# Altium footprint library cool_library.PcbLib: 1182 footprints (part 17 of 75)
Each footprint in its own frame and in the unit in brackets; x right, y up, seen from the top. Pads: shape width x height; smd on the part's side, far side on the other; paste and mask are expansions set on the pad; w line width, h text height; cw(c..) or ccw(c..) is an arc to the next point about the centre after c.
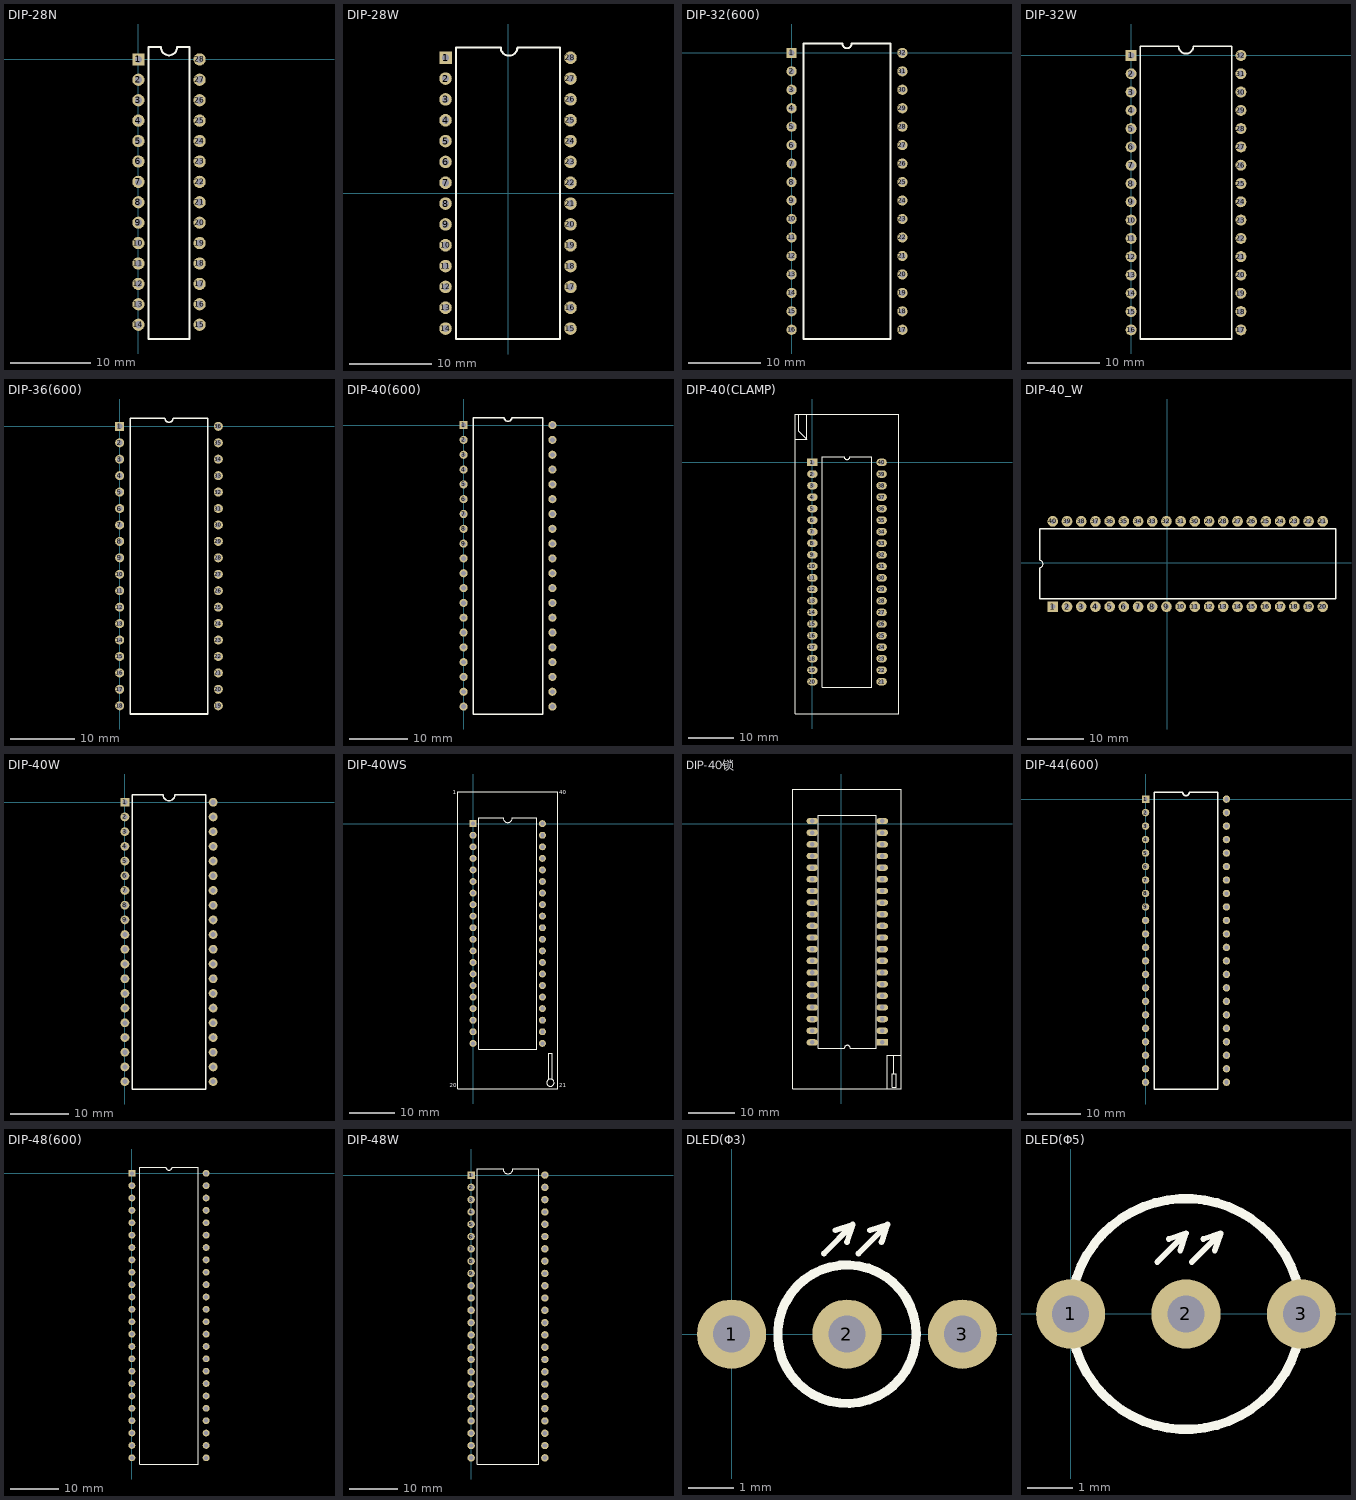
[diagram p16: the footprints below, top view; thin cyan lines are the x and y axes]

## DIP-28N [mil]
pads (28):
  rect 60x60 hole 35: 1(0,0)
  round 60 hole 35: 2(0,-100) 3(0,-200) 4(0,-300) 5(0,-400) 6(0,-500) 7(0,-600) 8(0,-700) 9(0,-800) 10(0,-900) 11(0,-1000) 12(0,-1100) 13(0,-1200) 14(0,-1300) 15(300,-1300) 16(300,-1200) 17(300,-1100) 18(300,-1000) 19(300,-900) 20(300,-800) 21(300,-700) 22(300,-600) 23(300,-500) 24(300,-400) 25(300,-300) 26(300,-200) 27(300,-100) 28(300,0)
Top Overlay:
  lines w10: 50,-1370 50,60 110,60 ccw(c150,60) 190,60 250,60 250,-1370 50,-1370

## DIP-28W [mil]
pads (28):
  rect 60x60 hole 35: 1(-300,650)
  round 60 hole 35: 2(-300,550) 3(-300,450) 4(-300,350) 5(-300,250) 6(-300,150) 7(-300,50) 8(-300,-50) 9(-300,-150) 10(-300,-250) 11(-300,-350) 12(-300,-450) 13(-300,-550) 14(-300,-650) 15(300,-650) 16(300,-550) 17(300,-450) 18(300,-350) 19(300,-250) 20(300,-150) 21(300,-50) 22(300,50) 23(300,150) 24(300,250) 25(300,350) 26(300,450) 27(300,550) 28(300,650)
Top Overlay:
  lines w10: -250,-700 -250,700 -35,700 ccw(c5,700) 45,700 250,700 250,-700 -250,-700

## DIP-32(600) [mil]
pads (32):
  rect 55x55 hole 32: 1(0,0)
  round 55 hole 32: 2(0,-100) 3(0,-200) 4(0,-300) 5(0,-400) 6(0,-500) 7(0,-600) 8(0,-700) 9(0,-800) 10(0,-900) 11(0,-1000) 12(0,-1100) 13(0,-1200) 14(0,-1300) 15(0,-1400) 16(0,-1500) 17(600,-1500) 18(600,-1400) 19(600,-1300) 20(600,-1200) 21(600,-1100) 22(600,-1000) 23(600,-900) 24(600,-800) 25(600,-700) 26(600,-600) 27(600,-500) 28(600,-400) 29(600,-300) 30(600,-200) 31(600,-100) 32(600,0)
Top Overlay:
  lines w10: 65,-1550 535,-1550 535,50 325,50 cw(c300,50) 275,50 65,50 65,-1550

## DIP-32W [mil]
pads (32):
  rect 60x60 hole 35: 1(0,0)
  round 60 hole 35: 2(0,-100) 3(0,-200) 4(0,-300) 5(0,-400) 6(0,-500) 7(0,-600) 8(0,-700) 9(0,-800) 10(0,-900) 11(0,-1000) 12(0,-1100) 13(0,-1200) 14(0,-1300) 15(0,-1400) 16(0,-1500) 17(600,-1500) 18(600,-1400) 19(600,-1300) 20(600,-1200) 21(600,-1100) 22(600,-1000) 23(600,-900) 24(600,-800) 25(600,-700) 26(600,-600) 27(600,-500) 28(600,-400) 29(600,-300) 30(600,-200) 31(600,-100) 32(600,0)
Top Overlay:
  lines w10: 50,-1550 550,-1550 550,50 340,50 cw(c300,50) 260,50 50,50 50,-1550

## DIP-36(600) [mil]
pads (36):
  rect 55x55 hole 32: 1(0,0)
  round 55 hole 32: 2(0,-100) 3(0,-200) 4(0,-300) 5(0,-400) 6(0,-500) 7(0,-600) 8(0,-700) 9(0,-800) 10(0,-900) 11(0,-1000) 12(0,-1100) 13(0,-1200) 14(0,-1300) 15(0,-1400) 16(0,-1500) 17(0,-1600) 18(0,-1700) 19(600,-1700) 20(600,-1600) 21(600,-1500) 22(600,-1400) 23(600,-1300) 24(600,-1200) 25(600,-1100) 26(600,-1000) 27(600,-900) 28(600,-800) 29(600,-700) 30(600,-600) 31(600,-500) 32(600,-400) 33(600,-300) 34(600,-200) 35(600,-100) 36(600,0)
Top Overlay:
  lines w10: 65,-1750 535,-1750 535,50 325,50 cw(c300,50) 275,50 65,50 65,-1750

## DIP-40(600) [mil]
pads (40):
  rect 55x55 hole 32: 1(0,0)
  round 55 hole 32: 2(0,-100) 3(0,-200) 4(0,-300) 5(0,-400) 6(0,-500) 7(0,-600) 8(0,-700) 9(0,-800) 10(0,-900) 11(0,-1000) 12(0,-1100) 13(0,-1200) 14(0,-1300) 15(0,-1400) 16(0,-1500) 17(0,-1600) 18(0,-1700) 19(0,-1800) 20(0,-1900) 21(600,-1900) 22(600,-1800) 23(600,-1700) 24(600,-1600) 25(600,-1500) 26(600,-1400) 27(600,-1300) 28(600,-1200) 29(600,-1100) 30(600,-1000) 31(600,-900) 32(600,-800) 33(600,-700) 34(600,-600) 35(600,-500) 36(600,-400) 37(600,-300) 38(600,-200) 39(600,-100) 40(600,0)
Top Overlay:
  lines w10: 65,-1950 535,-1950 535,50 325,50 cw(c300,50) 275,50 65,50 65,-1950

## DIP-40(CLAMP) [mil]
pads (40):
  rect 90x65 hole 40: 1(0,0)
  oval 90x65 hole 40: 2(0,-100) 3(0,-200) 4(0,-300) 5(0,-400) 6(0,-500) 7(0,-600) 8(0,-700) 9(0,-800) 10(0,-900) 11(0,-1000) 12(0,-1100) 13(0,-1200) 14(0,-1300) 15(0,-1400) 16(0,-1500) 17(0,-1600) 18(0,-1700) 19(0,-1800) 20(0,-1900) 21(600,-1900) 22(600,-1800) 23(600,-1700) 24(600,-1600) 25(600,-1500) 26(600,-1400) 27(600,-1300) 28(600,-1200) 29(600,-1100) 30(600,-1000) 31(600,-900) 32(600,-800) 33(600,-700) 34(600,-600) 35(600,-500) 36(600,-400) 37(600,-300) 38(600,-200) 39(600,-100) 40(600,0)
Top Overlay:
  lines w10: -150,200 -50,200 ; -120,410 -120,270 -50,200 ; -50,420 -50,200 ; -150,-2180 -150,420 750,420 750,-2180 -150,-2180 ; 85,-1950 85,50 275,50 ccw(c300,50) 325,50 515,50 515,-1950 85,-1950

## DIP-40_W [mil]
height 177.17
pads (40):
  rect 75x75 hole 36: 1(-807.02,-309.59)
  round 75 hole 36: 2(-707.02,-309.59) 3(-607.02,-309.59) 4(-507.02,-309.59) 5(-407.02,-309.59) 6(-307.02,-309.59) 7(-207.02,-309.59) 8(-107.02,-309.59) 9(-7.02,-309.59) 10(92.98,-309.59) 11(192.98,-309.59) 12(292.98,-309.59) 13(392.98,-309.59) 14(492.98,-309.59) 15(592.98,-309.59) 16(692.98,-309.59) 17(792.98,-309.59) 18(892.98,-309.59) 19(992.98,-309.59) 20(1092.98,-309.59) 21(1092.98,290.41) 22(992.98,290.41) 23(892.98,290.41) 24(792.98,290.41) 25(692.98,290.41) 26(592.98,290.41) 27(492.98,290.41) 28(392.98,290.41) 29(292.98,290.41) 30(192.98,290.41) 31(92.98,290.41) 32(-7.02,290.41) 33(-107.02,290.41) 34(-207.02,290.41) 35(-307.02,290.41) 36(-407.02,290.41) 37(-507.02,290.41) 38(-607.02,290.41) 39(-707.02,290.41) 40(-807.02,290.41)
Top Overlay:
  lines w7.87: -900.33,-34.59 ccw(c-900.33,-9.59) -900.33,15.41
  lines w10: -900.33,-34.59 -900.33,-255 1186.28,-255 1186.28,240 -900.33,240 -900.33,15.41
3D body: height 224.41, standoff -101.57, extent -892.48,-314.92 1172.48,294.93

## DIP-40W [mil]
pads (40):
  rect 60x60 hole 35: 1(0,0)
  round 60 hole 35: 2(0,-100) 3(0,-200) 4(0,-300) 5(0,-400) 6(0,-500) 7(0,-600) 8(0,-700) 9(0,-800) 10(0,-900) 11(0,-1000) 12(0,-1100) 13(0,-1200) 14(0,-1300) 15(0,-1400) 16(0,-1500) 17(0,-1600) 18(0,-1700) 19(0,-1800) 20(0,-1900) 21(600,-1900) 22(600,-1800) 23(600,-1700) 24(600,-1600) 25(600,-1500) 26(600,-1400) 27(600,-1300) 28(600,-1200) 29(600,-1100) 30(600,-1000) 31(600,-900) 32(600,-800) 33(600,-700) 34(600,-600) 35(600,-500) 36(600,-400) 37(600,-300) 38(600,-200) 39(600,-100) 40(600,0)
Top Overlay:
  lines w10: 50,-1950 550,-1950 550,50 340,50 cw(c300,50) 260,50 50,50 50,-1950

## DIP-40WS [mil]
pads (40):
  rect 60x60 hole 35.43: 1(0,0)
  round 60 hole 35.43: 2(0,-100) 3(0,-200) 4(0,-300) 5(0,-400) 6(0,-500) 8(0,-700) 9(0,-800) 10(0,-900) 11(0,-1000) 12(0,-1100) 13(0,-1200) 14(0,-1300) 15(0,-1400) 16(0,-1500) 17(0,-1600) 18(0,-1700) 19(0,-1800) 20(0,-1900) 21(600,-1900) 22(600,-1800) 23(600,-1700) 24(600,-1600) 25(600,-1500) 26(600,-1400) 27(600,-1300) 28(600,-1200) 29(600,-1100) 30(600,-1000) 31(600,-900) 32(600,-800) 33(600,-700) 34(600,-600) 35(600,-500) 36(600,-400) 37(600,-300) 38(600,-200) 39(600,-100) 40(600,0)
  round 60 hole 35.43 paste+0: 7(0,-600)
Top Overlay:
  circle w10: c669.38,-2240 r31.5
  lines w10: 655,-2210 655,-1985 683.77,-1985 683.77,-2210 ; -133.07,-2293.7 733.07,-2293.7 733.07,275.59 -133.07,275.59 -133.07,-2293.7 ; 50,-1950 50,50 260,50 ccw(c300,50) 340,50 550,50 550,-1950 50,-1950
  text "40" at 745,240 h60
  text "21" at 745,-2295 h60
  text "20" at -200,-2295 h60
  text "1" at -175,240 h60

## DIP-40锁 [mm]
pads (40):
  rect 2.5x1.38 hole 1: 1(8.89,-47.65)
  oval 2.5x1.38 hole 1: 2(8.89,-45.11) 3(8.89,-42.57) 4(8.89,-40.03) 5(8.89,-37.49) 6(8.89,-34.95) 7(8.89,-32.41) 8(8.89,-29.87) 9(8.89,-27.33) 10(8.89,-24.79) 11(8.89,-22.25) 12(8.89,-19.71) 13(8.89,-17.17) 14(8.89,-14.63) 15(8.89,-12.09) 16(8.89,-9.55) 17(8.89,-7.01) 18(8.89,-4.47) 19(8.89,-1.93) 20(8.89,0.61) 21(-6.35,0.61) 22(-6.35,-1.93) 23(-6.35,-4.47) 24(-6.35,-7.01) 25(-6.35,-9.55) 26(-6.35,-12.09) 27(-6.35,-14.63) 28(-6.35,-17.17) 29(-6.35,-19.71) 30(-6.35,-22.25) 31(-6.35,-24.79) 32(-6.35,-27.33) 33(-6.35,-29.87) 34(-6.35,-32.41) 35(-6.35,-34.95) 36(-6.35,-37.49) 37(-6.35,-40.03) 38(-6.35,-42.57) 39(-6.35,-45.11) 40(-6.35,-47.65)
Top Overlay:
  lines w0.254: 10.033,-57.81 10.033,-52.603 10.033,-50.444 12.954,-50.444 ; 10.16,7.595 13.081,7.595 13.081,-48.412 ; 10.287,7.595 -10.668,7.595 -10.668,-47.65 -10.668,-57.81 13.081,-57.81 13.081,-47.65 ; 11.049,-54.635 11.049,-54.508 ; 11.43,-54.508 11.43,-50.444 ; 11.049,-54.508 11.938,-54.508 11.938,-57.429 11.049,-57.429 11.049,-54.508 ; -5.08,-48.92 0.635,-48.92 cw(c1.27,-48.92) 1.905,-48.92 7.62,-48.92 7.62,1.88 -5.08,1.88 -5.08,-48.92

## DIP-44(600) [mil]
pads (44):
  rect 55x55 hole 32: 1(0,0)
  round 55 hole 32: 2(0,-100) 3(0,-200) 4(0,-300) 5(0,-400) 6(0,-500) 7(0,-600) 8(0,-700) 9(0,-800) 10(0,-900) 11(0,-1000) 12(0,-1100) 13(0,-1200) 14(0,-1300) 15(0,-1400) 16(0,-1500) 17(0,-1600) 18(0,-1700) 19(0,-1800) 20(0,-1900) 21(0,-2000) 22(0,-2100) 23(600,-2100) 24(600,-2000) 25(600,-1900) 26(600,-1800) 27(600,-1700) 28(600,-1600) 29(600,-1500) 30(600,-1400) 31(600,-1300) 32(600,-1200) 33(600,-1100) 34(600,-1000) 35(600,-900) 36(600,-800) 37(600,-700) 38(600,-600) 39(600,-500) 40(600,-400) 41(600,-300) 42(600,-200) 43(600,-100) 44(600,0)
Top Overlay:
  lines w10: 65,-2150 535,-2150 535,50 325,50 cw(c300,50) 275,50 65,50 65,-2150

## DIP-48(600) [mil]
pads (48):
  rect 55x55 hole 32: 1(0,0)
  round 55 hole 32: 2(0,-100) 3(0,-200) 4(0,-300) 5(0,-400) 6(0,-500) 7(0,-600) 8(0,-700) 9(0,-800) 10(0,-900) 11(0,-1000) 12(0,-1100) 13(0,-1200) 14(0,-1300) 15(0,-1400) 16(0,-1500) 17(0,-1600) 18(0,-1700) 19(0,-1800) 20(0,-1900) 21(0,-2000) 22(0,-2100) 23(0,-2200) 24(0,-2300) 25(600,-2300) 26(600,-2200) 27(600,-2100) 28(600,-2000) 29(600,-1900) 30(600,-1800) 31(600,-1700) 32(600,-1600) 33(600,-1500) 34(600,-1400) 35(600,-1300) 36(600,-1200) 37(600,-1100) 38(600,-1000) 39(600,-900) 40(600,-800) 41(600,-700) 42(600,-600) 43(600,-500) 44(600,-400) 45(600,-300) 46(600,-200) 47(600,-100) 48(600,0)
Top Overlay:
  lines w10: 65,-2350 535,-2350 535,50 325,50 cw(c300,50) 275,50 65,50 65,-2350

## DIP-48W [mil]
pads (48):
  rect 60x60 hole 35: 1(0,0)
  round 60 hole 35: 2(0,-100) 3(0,-200) 4(0,-300) 5(0,-400) 6(0,-500) 7(0,-600) 8(0,-700) 9(0,-800) 10(0,-900) 11(0,-1000) 12(0,-1100) 13(0,-1200) 14(0,-1300) 15(0,-1400) 16(0,-1500) 17(0,-1600) 18(0,-1700) 19(0,-1800) 20(0,-1900) 21(0,-2000) 22(0,-2100) 23(0,-2200) 24(0,-2300) 25(600,-2300) 26(600,-2200) 27(600,-2100) 28(600,-2000) 29(600,-1900) 30(600,-1800) 31(600,-1700) 32(600,-1600) 33(600,-1500) 34(600,-1400) 35(600,-1300) 36(600,-1200) 37(600,-1100) 38(600,-1000) 39(600,-900) 40(600,-800) 41(600,-700) 42(600,-600) 43(600,-500) 44(600,-400) 45(600,-300) 46(600,-200) 47(600,-100) 48(600,0)
Top Overlay:
  lines w10: 50,-2350 50,50 260,50 ccw(c300,50) 340,50 550,50 550,-2350 50,-2350

## DLED(Φ3) [mil]
pads (3):
  round 60 hole 32: 1(0,0) 2(100,0) 3(200,0)
Top Overlay:
  circle w8: c100,0 r60
  lines w5: 80,70 105,95 ; 90,90 105,95 ; 100,80 105,95 ; 110,70 135,95 ; 120,90 135,95 ; 130,80 135,95

## DLED(Φ5) [mil]
pads (3):
  round 60 hole 32: 1(0,0) 2(100,0) 3(200,0)
Top Overlay:
  circle w8: c100,0 r100
  lines w5: 75,45 100,70 ; 85,65 100,70 ; 95,55 100,70 ; 105,45 130,70 ; 115,65 130,70 ; 125,55 130,70